# Altium footprint library connectors.PcbLib: 256 footprints (part 6 of 16)
Each footprint in its own frame and in the unit in brackets; x right, y up, seen from the top. Pads: shape width x height; smd on the part's side, far side on the other; paste and mask are expansions set on the pad; w line width, h text height; cw(c..) or ccw(c..) is an arc to the next point about the centre after c.
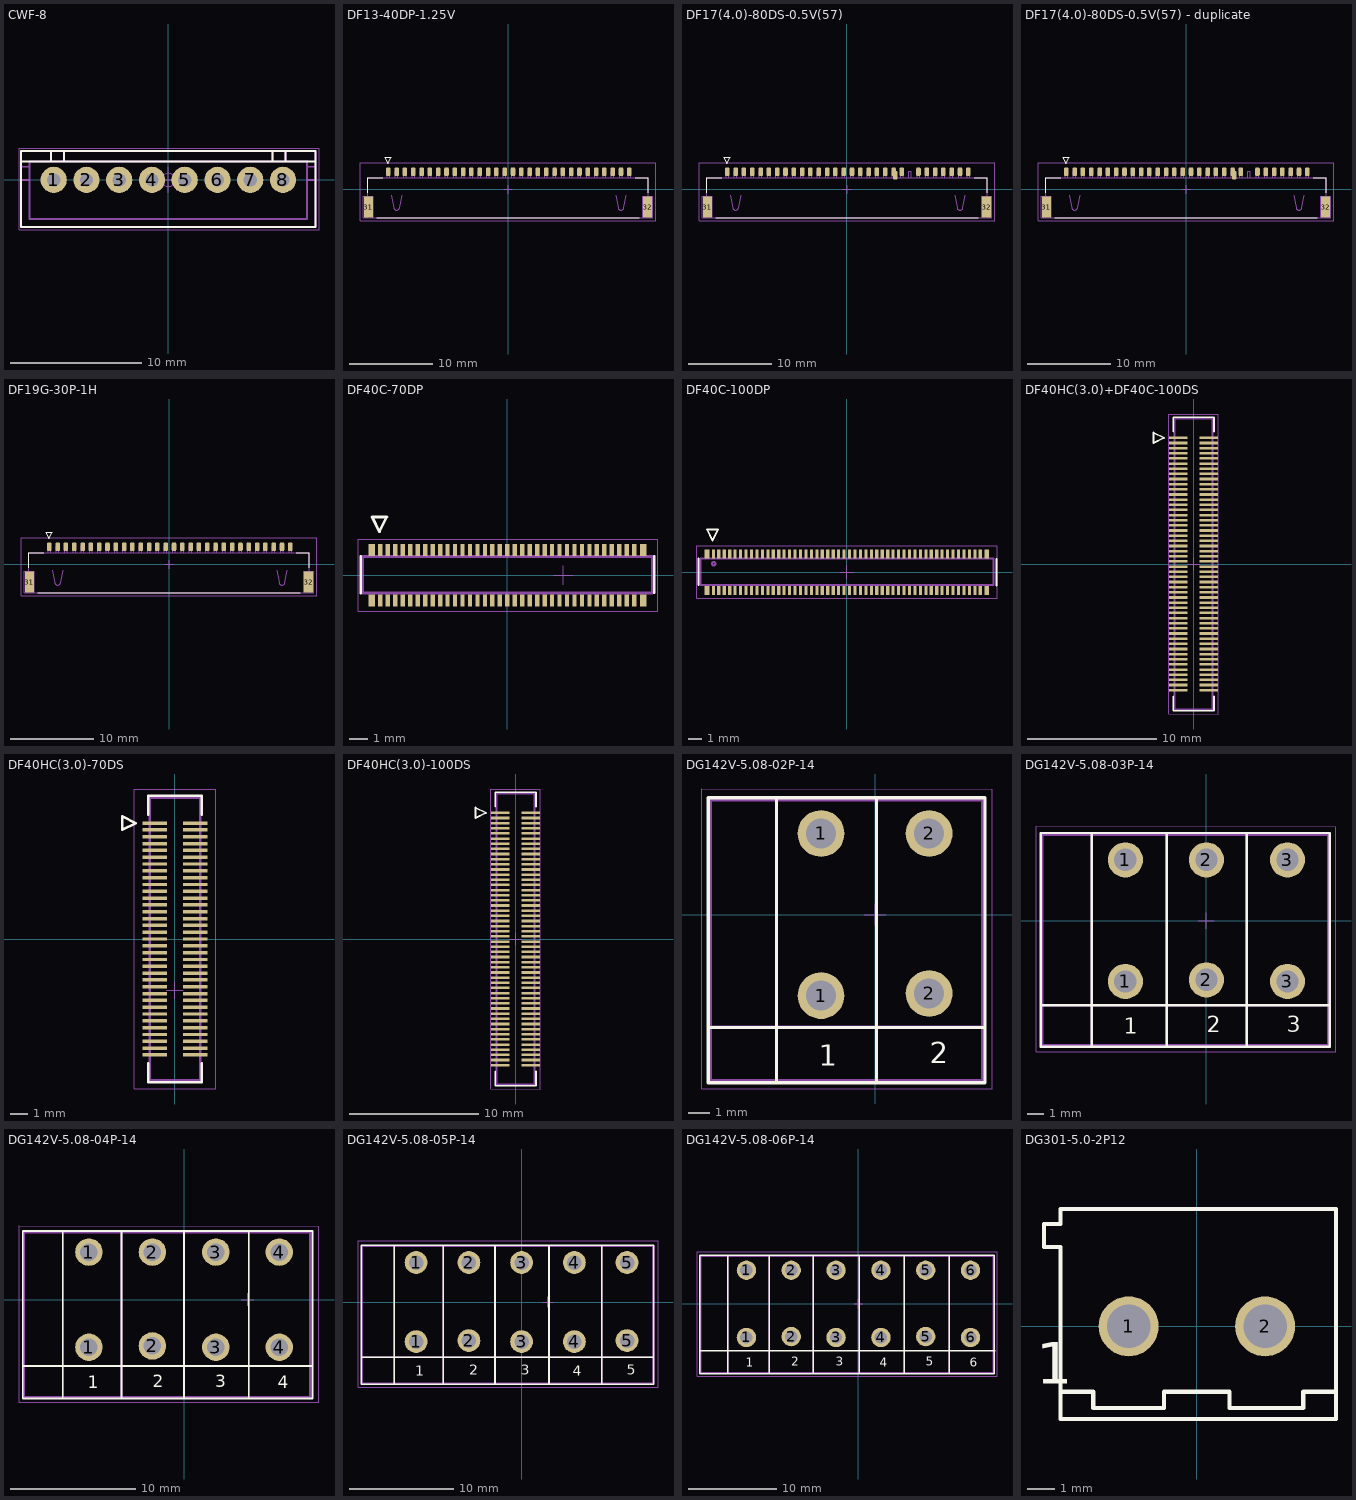
[diagram p5: the footprints below, top view; thin cyan lines are the x and y axes]

## CWF-8 [mm]
pads (8):
  round 2 hole 1: 1(-8.75,0) 2(-6.25,0) 3(-3.75,0) 4(-1.25,0) 5(1.25,0) 6(3.75,0) 7(6.25,0) 8(8.75,0)
Top Overlay:
  lines w0.15: -11.24,1.4 11.25,1.4 ; -8.95,1.4 -8.95,2.2 ; -7.95,1.4 -7.95,2.2 ; 7.95,1.4 7.95,2.2 ; 8.95,1.4 8.95,2.2 ; -11.24,-3.6 11.25,-3.6 11.25,2.2 -11.24,2.2 -11.24,-3.6
  text "." at -10,2.7 h1.52
TopAssy 13:
  lines w0.15: -11.24,0 -10.6,0 ; -11.24,1 -10.6,1 ; -8.95,1.5 -8.95,2.2 ; -7.95,1.5 -7.95,2.2 ; 7.95,1.5 7.95,2.2 ; 8.95,1.5 8.95,2.2 ; 10.6,0 11.25,0 ; 10.6,1 11.25,1 ; -11.24,-3.6 11.25,-3.6 11.25,2.2 -11.24,2.2 -11.24,-3.6 ; -10.6,-3 10.6,-3 10.6,1.4 -10.6,1.4 -10.6,-3
TopCourt 15:
  circle w0.05: c0,-0.007 r0.5
  lines w0.05: -0.998,-0.007 1.002,-0.007 ; 0,-1 0,1 ; -11.4,-3.8 11.5,-3.8 11.5,2.402 -11.4,2.402 -11.4,-3.8
3D body "User Library-CWF-8.step": height 7.05, standoff -3.45, extent -11.25,-3.55 11.25,2.2

## DF13-40DP-1.25V [mm] "1.25 mm Contact Pitch, Board-to-Cable"
height 1
pads (32):
  rrect50% 0.55x1 smd: 1(-14.4,2.125) 2(-13.4,2.125) 3(-12.4,2.125) 4(-11.4,2.125) 5(-10.4,2.125) 6(-9.4,2.125) 7(-8.4,2.125) 8(-7.4,2.125) 9(-6.4,2.125) 10(-5.4,2.125) 11(-4.4,2.125) 12(-3.4,2.125) 13(-2.4,2.125) 14(-1.4,2.125) 15(-0.4,2.125) 16(0.6,2.125) 17(1.6,2.125) 18(2.6,2.125) 19(3.6,2.125) 20(4.6,2.125) 21(5.6,2.125) 22(6.6,2.125) 23(7.6,2.125) 24(8.6,2.125) 25(9.6,2.125) 26(10.6,2.125) 27(11.6,2.125) 28(12.6,2.125) 29(13.6,2.125) 30(14.6,2.125)
  rect 1.1x2.5 smd: 31(-16.8,-2.125) 32(16.8,-2.125)
Top Overlay:
  lines w0.15: -16.9,-0.425 -16.9,1.375 -15.1,1.375 ; -15.8,-3.425 15.8,-3.425 ; 15.3,1.375 16.9,1.375 16.9,-0.425 ; -14.85,3.9 -14.05,3.9 -14.45,3.1 -14.85,3.9
TopAssy 13:
  lines w0.15: -17.1,-3.4 -17.1,-0.8 ; -14.55,1.4 -14.55,2.2 -14.25,2.2 -14.25,1.4 ; -14.05,-0.7 -13.75,-2.2 ccw(c-13.4,-2.15) -13.05,-2.2 -12.75,-0.7 ; -13.55,1.4 -13.55,2.2 -13.25,2.2 -13.25,1.4 ; -12.55,1.4 -12.55,2.2 -12.25,2.2 -12.25,1.4 ; -11.55,1.4 -11.55,2.2 -11.25,2.2 -11.25,1.4 ; -10.55,1.4 -10.55,2.2 -10.25,2.2 -10.25,1.4 ; -9.55,1.4 -9.55,2.2 -9.25,2.2 -9.25,1.4 ; -8.55,1.4 -8.55,2.2 -8.25,2.2 -8.25,1.4 ; -7.55,1.4 -7.55,2.2 -7.25,2.2 -7.25,1.4 ; -6.55,1.4 -6.55,2.2 -6.25,2.2 -6.25,1.4 ; -5.55,1.4 -5.55,2.2 -5.25,2.2 -5.25,1.4 ; -4.55,1.4 -4.55,2.2 -4.25,2.2 -4.25,1.4 ; -3.55,1.4 -3.55,2.2 -3.25,2.2 -3.25,1.4 ; -2.55,1.4 -2.55,2.2 -2.25,2.2 -2.25,1.4 ; -1.55,1.4 -1.55,2.2 -1.25,2.2 -1.25,1.4 ; -0.55,1.4 -0.55,2.2 -0.25,2.2 -0.25,1.4 ; 0.45,1.4 0.45,2.2 0.75,2.2 0.75,1.4 ; 1.45,1.4 1.45,2.2 1.75,2.2 1.75,1.4 ; 2.45,1.4 2.45,2.2 2.75,2.2 2.75,1.4 ; 3.45,1.4 3.45,2.2 3.75,2.2 3.75,1.4 ; 4.45,1.4 4.45,2.2 4.75,2.2 4.75,1.4 ; 5.45,1.4 5.45,2.2 5.75,2.2 5.75,1.4 ; 6.45,1.4 6.45,2.2 6.75,2.2 6.75,1.4 ; 7.45,1.4 7.45,2.2 7.75,2.2 7.75,1.4 ; 8.45,1.4 8.45,2.2 8.75,2.2 8.75,1.4 ; 9.45,1.4 9.45,2.2 9.75,2.2 9.75,1.4 ; 10.45,1.4 10.45,2.2 10.75,2.2 10.75,1.4 ; 11.45,1.4 11.45,2.2 11.75,2.2 11.75,1.4 ; 12.45,1.4 12.45,2.2 12.75,2.2 12.75,1.4 ; 12.95,-0.7 13.25,-2.2 ccw(c13.6,-2.15) 13.95,-2.2 14.25,-0.7 ; 13.45,1.4 13.45,2.2 13.75,2.2 13.75,1.4 ; 14.45,1.4 14.45,2.2 14.75,2.2 14.75,1.4 ; 17.1,-3.4 17.1,-0.8 ; -17.4,-3.4 -17.4,-0.8 -16.2,-0.8 -16.2,-3.4 -17.4,-3.4 ; -16.9,-3.4 -16.9,1.375 16.9,1.375 16.9,-3.4 -16.9,-3.4 ; 16.2,-3.4 17.4,-3.4 17.4,-0.8 16.2,-0.8 16.2,-3.4
TopCourt 15:
  lines w0.05: -0.5,0 0.5,0 ; 0,-0.5 0,0.5 ; -17.8,-3.8 17.8,-3.8 17.8,3.2 -17.8,3.2 -17.8,-3.8
3D body "User Library-df13.step": height 5.63, standoff 0.23, extent -15.45,-2.125 15.4,4.775

## DF17(4.0)-80DS-0.5V(57) [mm] "0.5 mm Contact Pitch, Board-to-Board FCI / Amphenol:"
height 3.5
pads (32):
  rrect50% 0.55x1 smd: 1(-14.4,2.125) 2(-13.4,2.125) 3(-12.4,2.125) 4(-11.4,2.125) 5(-10.4,2.125) 6(-9.4,2.125) 7(-8.4,2.125) 8(-7.4,2.125) 9(-6.4,2.125) 10(-5.4,2.125) 11(-4.4,2.125) 12(-3.4,2.125) 13(-2.4,2.125) 14(-1.4,2.125) 15(-0.4,2.125) 16(0.6,2.125) 17(1.6,2.125) 18(2.6,2.125) 19(3.6,2.125) 20(4.6,2.125) 21(5.6,2.125) 22(6.6,2.125) 23(5.8,1.7) 24(8.6,2.125) 25(9.6,2.125) 26(10.6,2.125) 27(11.6,2.125) 28(12.6,2.125) 29(13.6,2.125) 30(14.6,2.125)
  rect 1.1x2.5 smd: 31(-16.8,-2.125) 32(16.8,-2.125)
Top Overlay:
  lines w0.15: -16.9,-0.425 -16.9,1.375 -15.1,1.375 ; -15.8,-3.425 15.8,-3.425 ; 15.3,1.375 16.9,1.375 16.9,-0.425 ; -14.85,3.9 -14.05,3.9 -14.45,3.1 -14.85,3.9
TopAssy 13:
  lines w0.15: -17.1,-3.4 -17.1,-0.8 ; -14.55,1.4 -14.55,2.2 -14.25,2.2 -14.25,1.4 ; -14.05,-0.7 -13.75,-2.2 ccw(c-13.4,-2.15) -13.05,-2.2 -12.75,-0.7 ; -13.55,1.4 -13.55,2.2 -13.25,2.2 -13.25,1.4 ; -12.55,1.4 -12.55,2.2 -12.25,2.2 -12.25,1.4 ; -11.55,1.4 -11.55,2.2 -11.25,2.2 -11.25,1.4 ; -10.55,1.4 -10.55,2.2 -10.25,2.2 -10.25,1.4 ; -9.55,1.4 -9.55,2.2 -9.25,2.2 -9.25,1.4 ; -8.55,1.4 -8.55,2.2 -8.25,2.2 -8.25,1.4 ; -7.55,1.4 -7.55,2.2 -7.25,2.2 -7.25,1.4 ; -6.55,1.4 -6.55,2.2 -6.25,2.2 -6.25,1.4 ; -5.55,1.4 -5.55,2.2 -5.25,2.2 -5.25,1.4 ; -4.55,1.4 -4.55,2.2 -4.25,2.2 -4.25,1.4 ; -3.55,1.4 -3.55,2.2 -3.25,2.2 -3.25,1.4 ; -2.55,1.4 -2.55,2.2 -2.25,2.2 -2.25,1.4 ; -1.55,1.4 -1.55,2.2 -1.25,2.2 -1.25,1.4 ; -0.55,1.4 -0.55,2.2 -0.25,2.2 -0.25,1.4 ; 0.45,1.4 0.45,2.2 0.75,2.2 0.75,1.4 ; 1.45,1.4 1.45,2.2 1.75,2.2 1.75,1.4 ; 2.45,1.4 2.45,2.2 2.75,2.2 2.75,1.4 ; 3.45,1.4 3.45,2.2 3.75,2.2 3.75,1.4 ; 4.45,1.4 4.45,2.2 4.75,2.2 4.75,1.4 ; 5.45,1.4 5.45,2.2 5.75,2.2 5.75,1.4 ; 6.45,1.4 6.45,2.2 6.75,2.2 6.75,1.4 ; 7.45,1.4 7.45,2.2 7.75,2.2 7.75,1.4 ; 8.45,1.4 8.45,2.2 8.75,2.2 8.75,1.4 ; 9.45,1.4 9.45,2.2 9.75,2.2 9.75,1.4 ; 10.45,1.4 10.45,2.2 10.75,2.2 10.75,1.4 ; 11.45,1.4 11.45,2.2 11.75,2.2 11.75,1.4 ; 12.45,1.4 12.45,2.2 12.75,2.2 12.75,1.4 ; 12.95,-0.7 13.25,-2.2 ccw(c13.6,-2.15) 13.95,-2.2 14.25,-0.7 ; 13.45,1.4 13.45,2.2 13.75,2.2 13.75,1.4 ; 14.45,1.4 14.45,2.2 14.75,2.2 14.75,1.4 ; 17.1,-3.4 17.1,-0.8 ; -17.4,-3.4 -17.4,-0.8 -16.2,-0.8 -16.2,-3.4 -17.4,-3.4 ; -16.9,-3.4 -16.9,1.375 16.9,1.375 16.9,-3.4 -16.9,-3.4 ; 16.2,-3.4 17.4,-3.4 17.4,-0.8 16.2,-0.8 16.2,-3.4
TopCourt 15:
  lines w0.05: -0.5,0 0.5,0 ; 0,-0.5 0,0.5 ; -17.8,-3.8 17.8,-3.8 17.8,3.2 -17.8,3.2 -17.8,-3.8
3D body "DF17(4_0)-80DS-0_5V.stp": height 5.33, standoff 0.23, extent -13.8,-3.45 11.2,2.25

## DF17(4.0)-80DS-0.5V(57) - duplicate [mm] "0.5 mm Contact Pitch, Board-to-Board FCI / Amphenol:"
height 3.5
pads (32):
  rrect50% 0.55x1 smd: 1(-14.4,2.125) 2(-13.4,2.125) 3(-12.4,2.125) 4(-11.4,2.125) 5(-10.4,2.125) 6(-9.4,2.125) 7(-8.4,2.125) 8(-7.4,2.125) 9(-6.4,2.125) 10(-5.4,2.125) 11(-4.4,2.125) 12(-3.4,2.125) 13(-2.4,2.125) 14(-1.4,2.125) 15(-0.4,2.125) 16(0.6,2.125) 17(1.6,2.125) 18(2.6,2.125) 19(3.6,2.125) 20(4.6,2.125) 21(5.6,2.125) 22(6.6,2.125) 23(5.8,1.7) 24(8.6,2.125) 25(9.6,2.125) 26(10.6,2.125) 27(11.6,2.125) 28(12.6,2.125) 29(13.6,2.125) 30(14.6,2.125)
  rect 1.1x2.5 smd: 31(-16.8,-2.125) 32(16.8,-2.125)
Top Overlay:
  lines w0.15: -16.9,-0.425 -16.9,1.375 -15.1,1.375 ; -15.8,-3.425 15.8,-3.425 ; 15.3,1.375 16.9,1.375 16.9,-0.425 ; -14.85,3.9 -14.05,3.9 -14.45,3.1 -14.85,3.9
TopAssy 13:
  lines w0.15: -17.1,-3.4 -17.1,-0.8 ; -14.55,1.4 -14.55,2.2 -14.25,2.2 -14.25,1.4 ; -14.05,-0.7 -13.75,-2.2 ccw(c-13.4,-2.15) -13.05,-2.2 -12.75,-0.7 ; -13.55,1.4 -13.55,2.2 -13.25,2.2 -13.25,1.4 ; -12.55,1.4 -12.55,2.2 -12.25,2.2 -12.25,1.4 ; -11.55,1.4 -11.55,2.2 -11.25,2.2 -11.25,1.4 ; -10.55,1.4 -10.55,2.2 -10.25,2.2 -10.25,1.4 ; -9.55,1.4 -9.55,2.2 -9.25,2.2 -9.25,1.4 ; -8.55,1.4 -8.55,2.2 -8.25,2.2 -8.25,1.4 ; -7.55,1.4 -7.55,2.2 -7.25,2.2 -7.25,1.4 ; -6.55,1.4 -6.55,2.2 -6.25,2.2 -6.25,1.4 ; -5.55,1.4 -5.55,2.2 -5.25,2.2 -5.25,1.4 ; -4.55,1.4 -4.55,2.2 -4.25,2.2 -4.25,1.4 ; -3.55,1.4 -3.55,2.2 -3.25,2.2 -3.25,1.4 ; -2.55,1.4 -2.55,2.2 -2.25,2.2 -2.25,1.4 ; -1.55,1.4 -1.55,2.2 -1.25,2.2 -1.25,1.4 ; -0.55,1.4 -0.55,2.2 -0.25,2.2 -0.25,1.4 ; 0.45,1.4 0.45,2.2 0.75,2.2 0.75,1.4 ; 1.45,1.4 1.45,2.2 1.75,2.2 1.75,1.4 ; 2.45,1.4 2.45,2.2 2.75,2.2 2.75,1.4 ; 3.45,1.4 3.45,2.2 3.75,2.2 3.75,1.4 ; 4.45,1.4 4.45,2.2 4.75,2.2 4.75,1.4 ; 5.45,1.4 5.45,2.2 5.75,2.2 5.75,1.4 ; 6.45,1.4 6.45,2.2 6.75,2.2 6.75,1.4 ; 7.45,1.4 7.45,2.2 7.75,2.2 7.75,1.4 ; 8.45,1.4 8.45,2.2 8.75,2.2 8.75,1.4 ; 9.45,1.4 9.45,2.2 9.75,2.2 9.75,1.4 ; 10.45,1.4 10.45,2.2 10.75,2.2 10.75,1.4 ; 11.45,1.4 11.45,2.2 11.75,2.2 11.75,1.4 ; 12.45,1.4 12.45,2.2 12.75,2.2 12.75,1.4 ; 12.95,-0.7 13.25,-2.2 ccw(c13.6,-2.15) 13.95,-2.2 14.25,-0.7 ; 13.45,1.4 13.45,2.2 13.75,2.2 13.75,1.4 ; 14.45,1.4 14.45,2.2 14.75,2.2 14.75,1.4 ; 17.1,-3.4 17.1,-0.8 ; -17.4,-3.4 -17.4,-0.8 -16.2,-0.8 -16.2,-3.4 -17.4,-3.4 ; -16.9,-3.4 -16.9,1.375 16.9,1.375 16.9,-3.4 -16.9,-3.4 ; 16.2,-3.4 17.4,-3.4 17.4,-0.8 16.2,-0.8 16.2,-3.4
TopCourt 15:
  lines w0.05: -0.5,0 0.5,0 ; 0,-0.5 0,0.5 ; -17.8,-3.8 17.8,-3.8 17.8,3.2 -17.8,3.2 -17.8,-3.8
3D body "DF17(4_0)-80DP-0_5V.stp": height 6.97, standoff 0.07, extent -14,-4 11,1.7

## DF19G-30P-1H [mm] "1 mm Contact Pitch, Board-to-Cable"
height 1
pads (32):
  rrect50% 0.55x1 smd: 1(-14.4,2.125) 2(-13.4,2.125) 3(-12.4,2.125) 4(-11.4,2.125) 5(-10.4,2.125) 6(-9.4,2.125) 7(-8.4,2.125) 8(-7.4,2.125) 9(-6.4,2.125) 10(-5.4,2.125) 11(-4.4,2.125) 12(-3.4,2.125) 13(-2.4,2.125) 14(-1.4,2.125) 15(-0.4,2.125) 16(0.6,2.125) 17(1.6,2.125) 18(2.6,2.125) 19(3.6,2.125) 20(4.6,2.125) 21(5.6,2.125) 22(6.6,2.125) 23(7.6,2.125) 24(8.6,2.125) 25(9.6,2.125) 26(10.6,2.125) 27(11.6,2.125) 28(12.6,2.125) 29(13.6,2.125) 30(14.6,2.125)
  rect 1.1x2.5 smd: 31(-16.8,-2.125) 32(16.8,-2.125)
Top Overlay:
  lines w0.15: -16.9,-0.425 -16.9,1.375 -15.1,1.375 ; -15.8,-3.425 15.8,-3.425 ; 15.3,1.375 16.9,1.375 16.9,-0.425 ; -14.85,3.9 -14.05,3.9 -14.45,3.1 -14.85,3.9
TopAssy 13:
  lines w0.15: -17.1,-3.4 -17.1,-0.8 ; -14.55,1.4 -14.55,2.2 -14.25,2.2 -14.25,1.4 ; -14.05,-0.7 -13.75,-2.2 ccw(c-13.4,-2.15) -13.05,-2.2 -12.75,-0.7 ; -13.55,1.4 -13.55,2.2 -13.25,2.2 -13.25,1.4 ; -12.55,1.4 -12.55,2.2 -12.25,2.2 -12.25,1.4 ; -11.55,1.4 -11.55,2.2 -11.25,2.2 -11.25,1.4 ; -10.55,1.4 -10.55,2.2 -10.25,2.2 -10.25,1.4 ; -9.55,1.4 -9.55,2.2 -9.25,2.2 -9.25,1.4 ; -8.55,1.4 -8.55,2.2 -8.25,2.2 -8.25,1.4 ; -7.55,1.4 -7.55,2.2 -7.25,2.2 -7.25,1.4 ; -6.55,1.4 -6.55,2.2 -6.25,2.2 -6.25,1.4 ; -5.55,1.4 -5.55,2.2 -5.25,2.2 -5.25,1.4 ; -4.55,1.4 -4.55,2.2 -4.25,2.2 -4.25,1.4 ; -3.55,1.4 -3.55,2.2 -3.25,2.2 -3.25,1.4 ; -2.55,1.4 -2.55,2.2 -2.25,2.2 -2.25,1.4 ; -1.55,1.4 -1.55,2.2 -1.25,2.2 -1.25,1.4 ; -0.55,1.4 -0.55,2.2 -0.25,2.2 -0.25,1.4 ; 0.45,1.4 0.45,2.2 0.75,2.2 0.75,1.4 ; 1.45,1.4 1.45,2.2 1.75,2.2 1.75,1.4 ; 2.45,1.4 2.45,2.2 2.75,2.2 2.75,1.4 ; 3.45,1.4 3.45,2.2 3.75,2.2 3.75,1.4 ; 4.45,1.4 4.45,2.2 4.75,2.2 4.75,1.4 ; 5.45,1.4 5.45,2.2 5.75,2.2 5.75,1.4 ; 6.45,1.4 6.45,2.2 6.75,2.2 6.75,1.4 ; 7.45,1.4 7.45,2.2 7.75,2.2 7.75,1.4 ; 8.45,1.4 8.45,2.2 8.75,2.2 8.75,1.4 ; 9.45,1.4 9.45,2.2 9.75,2.2 9.75,1.4 ; 10.45,1.4 10.45,2.2 10.75,2.2 10.75,1.4 ; 11.45,1.4 11.45,2.2 11.75,2.2 11.75,1.4 ; 12.45,1.4 12.45,2.2 12.75,2.2 12.75,1.4 ; 12.95,-0.7 13.25,-2.2 ccw(c13.6,-2.15) 13.95,-2.2 14.25,-0.7 ; 13.45,1.4 13.45,2.2 13.75,2.2 13.75,1.4 ; 14.45,1.4 14.45,2.2 14.75,2.2 14.75,1.4 ; 17.1,-3.4 17.1,-0.8 ; -17.4,-3.4 -17.4,-0.8 -16.2,-0.8 -16.2,-3.4 -17.4,-3.4 ; -16.9,-3.4 -16.9,1.375 16.9,1.375 16.9,-3.4 -16.9,-3.4 ; 16.2,-3.4 17.4,-3.4 17.4,-0.8 16.2,-0.8 16.2,-3.4
TopCourt 15:
  lines w0.05: -0.5,0 0.5,0 ; 0,-0.5 0,0.5 ; -17.8,-3.8 17.8,-3.8 17.8,3.2 -17.8,3.2 -17.8,-3.8
3D body "DF19G-30P_K180114005_Stig-Wahlstrom.step": height 1.66, standoff 0.01, extent -17,-3.375 16.95,2.325

## DF40C-70DP [mm] "0.5 mm Contact Pitch, Board-to-Board FCI / Amphenol:"
height 3.5
pads (74):
  rect 0.35x0.66 smd: 0(-7.275,-1.355) 0(-7.275,1.355) 0(7.275,-1.355) 0(7.275,1.355)
  rect 0.23x0.66 smd: 1(-6.8,1.355) 2(-6.8,-1.355) 3(-6.4,1.355) 4(-6.4,-1.355) 5(-6,1.355) 6(-6,-1.355) 7(-5.6,1.355) 8(-5.6,-1.355) 9(-5.2,1.355) 10(-5.2,-1.355) 11(-4.8,1.355) 12(-4.8,-1.355) 13(-4.4,1.355) 14(-4.4,-1.355) 15(-4,1.355) 16(-4,-1.355) 17(-3.6,1.355) 18(-3.6,-1.355) 19(-3.2,1.355) 20(-3.2,-1.355) 21(-2.8,1.355) 22(-2.8,-1.355) 23(-2.4,1.355) 24(-2.4,-1.355) 25(-2,1.355) 26(-2,-1.355) 27(-1.6,1.355) 28(-1.6,-1.355) 29(-1.2,1.355) 30(-1.2,-1.355) 31(-0.8,1.355) 32(-0.8,-1.355) 33(-0.4,1.355) 34(-0.4,-1.355) 35(0,1.355) 36(0,-1.355) 37(0.4,1.355) 38(0.4,-1.355) 39(0.8,1.355) 40(0.8,-1.355) 41(1.2,1.355) 42(1.2,-1.355) 43(1.6,1.355) 44(1.6,-1.355) 45(2,1.355) 46(2,-1.355) 47(2.4,1.355) 48(2.4,-1.355) 49(2.8,1.355) 50(2.8,-1.355) 51(3.2,1.355) 52(3.2,-1.355) 53(3.6,1.355) 54(3.6,-1.355) 55(4,1.355) 56(4,-1.355) 57(4.4,1.355) 58(4.4,-1.355) 59(4.8,1.355) 60(4.8,-1.355) 61(5.2,1.355) 62(5.2,-1.355) 63(5.6,1.355) 64(5.6,-1.355) 65(6,1.355) 66(6,-1.355) 67(6.4,1.355) 68(6.4,-1.355) 69(6.8,1.355) 70(6.8,-1.355)
Top Overlay:
  lines w0.15: -7.85,-0.95 -7.85,1 ; 7.875,-0.925 7.875,1.025 ; -7.25,3.13 -6.45,3.13 -6.85,2.33 -7.25,3.13
TopAssy 13:
  lines w0.15: -7.75,-0.945 7.775,-0.945 7.775,1.005 -7.75,1.005 -7.75,-0.945
TopCourt 15:
  lines w0.05: 2.5,0 3.5,0 ; 3,-0.5 3,0.5 ; -8,-1.92 8.075,-1.92 8.075,1.93 -8,1.93 -8,-1.92
3D body "DF40C-70DP.stp": height 1.12, standoff -0.02, extent -7.75,-1.465 7.77,1.505

## DF40C-100DP [mm] "0.5 mm Contact Pitch, Board-to-Board FCI / Amphenol:"
height 3.5
pads (104):
  rect 0.35x0.66 smd mask+0.03: 0(-10.275,-1.355) 0(-10.275,1.355) 0(10.275,-1.355) 0(10.275,1.355)
  rect 0.23x0.66 smd mask+0.03: 1(-9.8,1.355) 2(-9.8,-1.355) 3(-9.4,1.355) 4(-9.4,-1.355) 5(-9,1.355) 6(-9,-1.355) 7(-8.6,1.355) 8(-8.6,-1.355) 9(-8.2,1.355) 10(-8.2,-1.355) 11(-7.8,1.355) 12(-7.8,-1.355) 13(-7.4,1.355) 14(-7.4,-1.355) 15(-7,1.355) 16(-7,-1.355) 17(-6.6,1.355) 18(-6.6,-1.355) 19(-6.2,1.355) 20(-6.2,-1.355) 21(-5.8,1.355) 22(-5.8,-1.355) 23(-5.4,1.355) 24(-5.4,-1.355) 25(-5,1.355) 26(-5,-1.355) 27(-4.6,1.355) 28(-4.6,-1.355) 29(-4.2,1.355) 30(-4.2,-1.355) 31(-3.8,1.355) 32(-3.8,-1.355) 33(-3.4,1.355) 34(-3.4,-1.355) 35(-3,1.355) 36(-3,-1.355) 37(-2.6,1.355) 38(-2.6,-1.355) 39(-2.2,1.355) 40(-2.2,-1.355) 41(-1.8,1.355) 42(-1.8,-1.355) 43(-1.4,1.355) 44(-1.4,-1.355) 45(-1,1.355) 46(-1,-1.355) 47(-0.6,1.355) 48(-0.6,-1.355) 49(-0.2,1.355) 50(-0.2,-1.355) 51(0.2,1.355) 52(0.2,-1.355) 53(0.6,1.355) 54(0.6,-1.355) 55(1,1.355) 56(1,-1.355) 57(1.4,1.355) 58(1.4,-1.355) 59(1.8,1.355) 60(1.8,-1.355) 61(2.2,1.355) 62(2.2,-1.355) 63(2.6,1.355) 64(2.6,-1.355) 65(3,1.355) 66(3,-1.355) 67(3.4,1.355) 68(3.4,-1.355) 69(3.8,1.355) 70(3.8,-1.355) 71(4.2,1.355) 72(4.2,-1.355) 73(4.6,1.355) 74(4.6,-1.355) 75(5,1.355) 76(5,-1.355) 77(5.4,1.355) 78(5.4,-1.355) 79(5.8,1.355) 80(5.8,-1.355) 81(6.2,1.355) 82(6.2,-1.355) 83(6.6,1.355) 84(6.6,-1.355) 85(7,1.355) 86(7,-1.355) 87(7.4,1.355) 88(7.4,-1.355) 89(7.8,1.355) 90(7.8,-1.355) 91(8.2,1.355) 92(8.2,-1.355) 93(8.6,1.355) 94(8.6,-1.355) 95(9,1.355) 96(9,-1.355) 97(9.4,1.355) 98(9.4,-1.355) 99(9.8,1.355) 100(9.8,-1.355)
Top Overlay:
  lines w0.15: -10.875,-0.945 -10.875,1.005 ; 11,-0.97 11,0.98 ; -10.25,3.13 -9.45,3.13 -9.85,2.33 -10.25,3.13
TopAssy 13:
  circle w0.15: c-9.775,0.625 r0.125
  lines w0.15: -10.75,-0.945 10.775,-0.945 10.775,1.005 -10.75,1.005 -10.75,-0.945
TopCourt 15:
  lines w0.05: -0.5,0 0.5,0 ; 0,-0.5 0,0.5 ; -11,-1.92 11.025,-1.92 11.025,1.93 -11,1.93 -11,-1.92
3D body "DF40C-100DP.stp": height 1.12, standoff -0.02, extent -10.76,-1.485 10.76,1.485

## DF40HC(3.0)+DF40C-100DS [mm] "0.5 mm Contact Pitch, Board-to-Board FCI / Amphenol:"
height 3.5
pads (100):
  rect 1.43x0.2 smd: 1(-1.19,9.8) 2(1.19,9.8) 3(-1.19,9.4) 4(1.19,9.4) 5(-1.19,9) 6(1.19,9) 7(-1.19,8.6) 8(1.19,8.6) 9(-1.19,8.2) 10(1.19,8.2) 11(-1.19,7.8) 12(1.19,7.8) 13(-1.19,7.4) 14(1.19,7.4) 15(-1.19,7) 16(1.19,7) 17(-1.19,6.6) 18(1.19,6.6) 19(-1.19,6.2) 20(1.19,6.2) 21(-1.19,5.8) 22(1.19,5.8) 23(-1.19,5.4) 24(1.19,5.4) 25(-1.19,5) 26(1.19,5) 27(-1.19,4.6) 28(1.19,4.6) 29(-1.19,4.2) 30(1.19,4.2) 31(-1.19,3.8) 32(1.19,3.8) 33(-1.19,3.4) 34(1.19,3.4) 35(-1.19,3) 36(1.19,3) 37(-1.19,2.6) 38(1.19,2.6) 39(-1.19,2.2) 40(1.19,2.2) 41(-1.19,1.8) 42(1.19,1.8) 43(-1.19,1.4) 44(1.19,1.4) 45(-1.19,1) 46(1.19,1) 47(-1.19,0.6) 48(1.19,0.6) 49(-1.19,0.2) 50(1.19,0.2) 51(-1.19,-0.2) 52(1.19,-0.2) 53(-1.19,-0.6) 54(1.19,-0.6) 55(-1.19,-1) 56(1.19,-1) 57(-1.19,-1.4) 58(1.19,-1.4) 59(-1.19,-1.8) 60(1.19,-1.8) 61(-1.19,-2.2) 62(1.19,-2.2) 63(-1.19,-2.6) 64(1.19,-2.6) 65(-1.19,-3) 66(1.19,-3) 67(-1.19,-3.4) 68(1.19,-3.4) 69(-1.19,-3.8) 70(1.19,-3.8) 71(-1.19,-4.2) 72(1.19,-4.2) 73(-1.19,-4.6) 74(1.19,-4.6) 75(-1.19,-5) 76(1.19,-5) 77(-1.19,-5.4) 78(1.19,-5.4) 79(-1.19,-5.8) 80(1.19,-5.8) 81(-1.19,-6.2) 82(1.19,-6.2) 83(-1.19,-6.6) 84(1.19,-6.6) 85(-1.19,-7) 86(1.19,-7) 87(-1.19,-7.4) 88(1.19,-7.4) 89(-1.19,-7.8) 90(1.19,-7.8) 91(-1.19,-8.2) 92(1.19,-8.2) 93(-1.19,-8.6) 94(1.19,-8.6) 95(-1.19,-9) 96(1.19,-9) 97(-1.19,-9.4) 98(1.19,-9.4) 99(-1.19,-9.8) 100(1.19,-9.8)
Top Overlay:
  lines w0.15: -1.575,-10.3 -1.575,-11.4 1.575,-11.4 1.575,-10.3 ; -1.575,10.3 -1.575,11.4 1.575,11.4 1.575,10.3 ; -3.1,9.4 -2.3,9.8 -3.1,10.2 -3.1,9.4
TopAssy 13:
  lines w0.15: -1.475,-11.3 -1.475,11.3 1.475,11.3 1.475,-11.3 -1.475,-11.3
TopCourt 15:
  lines w0.05: -0.5,0 0.5,0 ; 0,-0.5 0,0.5 ; -1.92,-11.65 -1.92,11.65 1.93,11.65 1.93,-11.65 -1.92,-11.65
3D body "DF40C-100DS.stp": height 1.44, standoff -0.01, extent -1.7,-11.3 1.68,11.3
3D body "DF40C-100DP.stp": height 3.05, standoff 1.91, extent -1.485,-10.76 1.485,10.76

## DF40HC(3.0)-70DS [mm] "0.5 mm Contact Pitch, Board-to-Board FCI / Amphenol:"
height 3.5
pads (70):
  rect 1.43x0.2 smd: 1(-1.19,6.8) 2(1.19,6.8) 3(-1.19,6.4) 4(1.19,6.4) 5(-1.19,6) 6(1.19,6) 7(-1.19,5.6) 8(1.19,5.6) 9(-1.19,5.2) 10(1.19,5.2) 11(-1.19,4.8) 12(1.19,4.8) 13(-1.19,4.4) 14(1.19,4.4) 15(-1.19,4) 16(1.19,4) 17(-1.19,3.6) 18(1.19,3.6) 19(-1.19,3.2) 20(1.19,3.2) 21(-1.19,2.8) 22(1.19,2.8) 23(-1.19,2.4) 24(1.19,2.4) 25(-1.19,2) 26(1.19,2) 27(-1.19,1.6) 28(1.19,1.6) 29(-1.19,1.2) 30(1.19,1.2) 31(-1.19,0.8) 32(1.19,0.8) 33(-1.19,0.4) 34(1.19,0.4) 35(-1.19,0) 36(1.19,0) 37(-1.19,-0.4) 38(1.19,-0.4) 39(-1.19,-0.8) 40(1.19,-0.8) 41(-1.19,-1.2) 42(1.19,-1.2) 43(-1.19,-1.6) 44(1.19,-1.6) 45(-1.19,-2) 46(1.19,-2) 47(-1.19,-2.4) 48(1.19,-2.4) 49(-1.19,-2.8) 50(1.19,-2.8) 51(-1.19,-3.2) 52(1.19,-3.2) 53(-1.19,-3.6) 54(1.19,-3.6) 55(-1.19,-4) 56(1.19,-4) 57(-1.19,-4.4) 58(1.19,-4.4) 59(-1.19,-4.8) 60(1.19,-4.8) 61(-1.19,-5.2) 62(1.19,-5.2) 63(-1.19,-5.6) 64(1.19,-5.6) 65(-1.19,-6) 66(1.19,-6) 67(-1.19,-6.4) 68(1.19,-6.4) 69(-1.19,-6.8) 70(1.19,-6.8)
Top Overlay:
  lines w0.15: -1.575,-7.3 -1.575,-8.4 1.575,-8.4 1.575,-7.3 ; -1.575,7.3 -1.575,8.4 1.575,8.4 1.575,7.3 ; -3.1,6.4 -3.1,7.2 -2.3,6.8 -3.1,6.4
TopAssy 13:
  lines w0.15: -1.475,-8.3 -1.475,8.3 1.475,8.3 1.475,-8.3 -1.475,-8.3
TopCourt 15:
  lines w0.05: -0.5,-3 0.5,-3 ; 0,-3.5 0,-2.5 ; -2.4,-8.8 2.4,-8.8 2.4,8.8 -2.4,8.8 -2.4,-8.8
3D body "DF40HC(3.0)-70DS.stp": height 2.9, standoff 0, extent -1.69,-8.3 1.69,8.3

## DF40HC(3.0)-100DS [mm] "0.5 mm Contact Pitch, Board-to-Board FCI / Amphenol:"
height 3.5
pads (100):
  rect 1.43x0.2 smd mask+0.05: 1(-1.19,9.8) 2(1.19,9.8) 3(-1.19,9.4) 4(1.19,9.4) 5(-1.19,9) 6(1.19,9) 7(-1.19,8.6) 8(1.19,8.6) 9(-1.19,8.2) 10(1.19,8.2) 11(-1.19,7.8) 12(1.19,7.8) 13(-1.19,7.4) 14(1.19,7.4) 15(-1.19,7) 16(1.19,7) 17(-1.19,6.6) 18(1.19,6.6) 19(-1.19,6.2) 20(1.19,6.2) 21(-1.19,5.8) 22(1.19,5.8) 23(-1.19,5.4) 24(1.19,5.4) 25(-1.19,5) 26(1.19,5) 27(-1.19,4.6) 28(1.19,4.6) 29(-1.19,4.2) 30(1.19,4.2) 31(-1.19,3.8) 32(1.19,3.8) 33(-1.19,3.4) 34(1.19,3.4) 35(-1.19,3) 36(1.19,3) 37(-1.19,2.6) 38(1.19,2.6) 39(-1.19,2.2) 40(1.19,2.2) 41(-1.19,1.8) 42(1.19,1.8) 43(-1.19,1.4) 44(1.19,1.4) 45(-1.19,1) 46(1.19,1) 47(-1.19,0.6) 48(1.19,0.6) 49(-1.19,0.2) 50(1.19,0.2) 51(-1.19,-0.2) 52(1.19,-0.2) 53(-1.19,-0.6) 54(1.19,-0.6) 55(-1.19,-1) 56(1.19,-1) 57(-1.19,-1.4) 58(1.19,-1.4) 59(-1.19,-1.8) 60(1.19,-1.8) 61(-1.19,-2.2) 62(1.19,-2.2) 63(-1.19,-2.6) 64(1.19,-2.6) 65(-1.19,-3) 66(1.19,-3) 67(-1.19,-3.4) 68(1.19,-3.4) 69(-1.19,-3.8) 70(1.19,-3.8) 71(-1.19,-4.2) 72(1.19,-4.2) 73(-1.19,-4.6) 74(1.19,-4.6) 75(-1.19,-5) 76(1.19,-5) 77(-1.19,-5.4) 78(1.19,-5.4) 79(-1.19,-5.8) 80(1.19,-5.8) 81(-1.19,-6.2) 82(1.19,-6.2) 83(-1.19,-6.6) 84(1.19,-6.6) 85(-1.19,-7) 86(1.19,-7) 87(-1.19,-7.4) 88(1.19,-7.4) 89(-1.19,-7.8) 90(1.19,-7.8) 91(-1.19,-8.2) 92(1.19,-8.2) 93(-1.19,-8.6) 94(1.19,-8.6) 95(-1.19,-9) 96(1.19,-9) 97(-1.19,-9.4) 98(1.19,-9.4) 99(-1.19,-9.8) 100(1.19,-9.8)
Top Overlay:
  lines w0.15: -1.575,-10.3 -1.575,-11.4 1.575,-11.4 1.575,-10.3 ; -1.575,10.3 -1.575,11.4 1.575,11.4 1.575,10.3 ; -3.1,9.4 -2.3,9.8 -3.1,10.2 -3.1,9.4
TopAssy 13:
  lines w0.15: -1.475,-11.3 -1.475,11.3 1.475,11.3 1.475,-11.3 -1.475,-11.3
TopCourt 15:
  lines w0.05: -0.5,0 0.5,0 ; 0,-0.5 0,0.5 ; -1.92,-11.65 -1.92,11.65 1.93,11.65 1.93,-11.65 -1.92,-11.65
3D body "DF40HC(3.0)-100DS-0.4V.stp": height 2.86, standoff -0.04, extent -1.69,-11.3 1.69,11.3

## DG142V-5.08-02P-14 [mm] "Connector, DG142V-5.08-02P-14, 5.08 mm Pitch"
height 14.1
pads (4):
  round 2.2 hole 1.4: 1(-2.54,-3.81) 1(-2.54,3.81) 2(2.54,-3.71) 2(2.54,3.81)
Top Overlay:
  lines w0.15: -7.74,-5.31 5.06,-5.31 ; -4.64,-7.91 -4.64,5.49 ; 0.06,-7.91 0.06,5.49 ; -7.84,-7.91 5.16,-7.91 5.16,5.49 -7.84,5.49 -7.84,-7.91
  text "2" at 2.56,-7 h1
  text "1" at -2.64,-7.1 h1
TopAssy 13:
  lines w0.15: -7.74,-5.3 5.06,-5.3 ; -4.64,-7.8 -4.64,5.4 ; 0.06,-7.81 0.06,5.39 ; -7.74,-7.81 -7.74,5.39 5.06,5.39 5.06,-7.81 -7.74,-7.81
TopCourt 15:
  lines w0.05: -0.5,0 0.5,0 ; 0,-0.5 0,0.5 ; -8.14,-8.2 5.5,-8.2 5.5,5.897 -8.14,5.901 -8.14,-8.2
3D body "DG142V-2-5.08.SLDPRT.1.x_t": height 14.1, standoff -3.5, extent -7.66,-7.81 4.94,5.39

## DG142V-5.08-03P-14 [mm] "Connector, DG142V-5.08-02P-14, 5.08 mm Pitch"
height 14.1
pads (6):
  round 2.2 hole 1.4: 1(-5.08,-3.81) 1(-5.08,3.81) 2(0,-3.71) 2(0,3.81) 3(5.08,-3.81) 3(5.08,3.81)
Top Overlay:
  lines w0.15: -10.28,-5.31 7.72,-5.31 ; -7.18,-7.91 -7.18,5.49 ; -2.48,-7.91 -2.48,5.49 ; 2.52,-7.91 2.52,5.49 ; -10.38,-7.91 7.72,-7.91 7.72,5.49 -10.38,5.49 -10.38,-7.91
  text "3" at 5.02,-7 h1
  text "2" at 0.02,-7 h1
  text "1" at -5.18,-7.1 h1
TopAssy 13:
  lines w0.15: -10.28,-5.3 7.62,-5.3 ; -7.18,-7.8 -7.18,5.4 ; -2.48,-7.81 -2.48,5.39 ; 2.52,-7.81 2.52,5.39 ; -10.28,-7.81 7.62,-7.81 7.62,5.39 -10.28,5.39 -10.28,-7.81
TopCourt 15:
  lines w0.05: -0.5,0 0.5,0 ; 0,-0.5 0,0.5 ; -10.68,-8.2 8.12,-8.2 8.12,5.895 -10.68,5.901 -10.68,-8.2
3D body "DG142V-3-5.08.SLDPRT.1.x_t": height 14.1, standoff -3.5, extent -10.2,-7.81 7.48,5.39

## DG142V-5.08-04P-14 [mm] "Connector, DG142V-5.08-04P-14, 5.08 mm Pitch"
height 14.1
pads (8):
  round 2.2 hole 1.4: 1(-7.62,-3.81) 1(-7.62,3.81) 2(-2.54,-3.71) 2(-2.54,3.81) 3(2.54,-3.81) 3(2.54,3.81) 4(7.62,-3.81) 4(7.62,3.81)
Top Overlay:
  lines w0.15: -12.82,-5.31 10.28,-5.31 ; -9.72,-7.91 -9.72,5.49 ; -5.02,-7.91 -5.02,5.49 ; -0.02,-7.91 -0.02,5.49 ; 5.18,-7.91 5.18,5.49 ; -12.92,-7.91 -12.92,5.49 10.28,5.49 10.28,-7.91 -12.92,-7.91
  text "1" at -7.72,-7.1 h1
  text "2" at -2.52,-7 h1
  text "3" at 2.48,-7 h1
  text "4" at 7.48,-7.1 h1
TopAssy 13:
  lines w0.15: -12.82,-5.3 10.08,-5.3 ; -9.72,-7.8 -9.72,5.4 ; -5.02,-7.81 -5.02,5.39 ; -0.02,-7.81 -0.02,5.39 ; 5.18,-7.81 5.18,5.39 ; 10.08,-7.9 10.08,5.4 ; 10.08,-7.81 -12.82,-7.81 -12.82,5.39 10.08,5.39
TopCourt 15:
  lines w0.05: 4.58,0 5.58,0 ; 5.08,-0.5 5.08,0.5 ; -13.22,-8.2 -13.22,5.901 10.8,5.894 10.8,-8.2 -13.22,-8.2
3D body "DG142V-4-5.08.SLDPRT.1.x_t": height 14.1, standoff -3.5, extent -12.74,-7.81 10.02,5.39

## DG142V-5.08-05P-14 [mm] "Connector, DG142V-5.08-05P-14, 5.08 mm Pitch"
height 14.1
pads (10):
  round 2.2 hole 1.4: 1(-10.16,-3.81) 1(-10.16,3.81) 2(-5.08,-3.71) 2(-5.08,3.81) 3(0,-3.81) 3(0,3.81) 4(5.08,-3.81) 4(5.08,3.81) 5(10.16,-3.71) 5(10.16,3.81)
Top Overlay:
  lines w0.15: -15.36,-5.31 12.74,-5.31 ; -12.26,-7.91 -12.26,5.49 ; -7.56,-7.91 -7.56,5.49 ; -2.56,-7.91 -2.56,5.49 ; 2.64,-7.91 2.64,5.49 ; 7.74,-7.91 7.74,5.49 ; -15.46,-7.91 12.74,-7.91 12.74,5.49 -15.46,5.49 -15.46,-7.91
  text "5" at 10.14,-7 h1
  text "4" at 4.94,-7.1 h1
  text "3" at -0.06,-7 h1
  text "2" at -5.06,-7 h1
  text "1" at -10.26,-7.1 h1
TopAssy 13:
  lines w0.15: -15.36,-5.3 12.64,-5.3 ; -12.26,-7.8 -12.26,5.4 ; -7.56,-7.81 -7.56,5.39 ; -2.56,-7.81 -2.56,5.39 ; 2.64,-7.81 2.64,5.39 ; 7.74,-7.8 7.74,5.4 ; -15.36,-7.81 -15.36,5.39 12.64,5.39 12.64,-7.81 -15.36,-7.81
TopCourt 15:
  lines w0.05: 2.04,0 3.04,0 ; 2.54,-0.5 2.54,0.5 ; -15.76,-8.2 13.14,-8.2 13.14,5.893 -15.76,5.901 -15.76,-8.2
3D body "DG142V-5-5.08.SLDPRT.1.x_t": height 14.1, standoff -3.5, extent -15.28,-7.81 12.56,5.39

## DG142V-5.08-06P-14 [mm] "Connector, DG142V-5.08-06P-14, 5.08 mm Pitch"
height 14.1
pads (12):
  round 2.2 hole 1.4: 1(-12.7,-3.81) 1(-12.7,3.81) 2(-7.62,-3.71) 2(-7.62,3.81) 3(-2.54,-3.81) 3(-2.54,3.81) 4(2.54,-3.81) 4(2.54,3.81) 5(7.62,-3.71) 5(7.62,3.81) 6(12.7,-3.81) 6(12.7,3.81)
Top Overlay:
  lines w0.15: -17.9,-5.31 15.5,-5.31 ; -14.8,-7.91 -14.8,5.49 ; -10.1,-7.91 -10.1,5.49 ; -5.1,-7.91 -5.1,5.49 ; 0.1,-7.91 0.1,5.49 ; 5.2,-7.91 5.2,5.49 ; 10.3,-7.91 10.3,5.49 ; -18,-7.91 15.4,-7.91 15.4,5.49 -18,5.49 -18,-7.91
  text "1" at -12.8,-7.1 h1
  text "2" at -7.6,-7 h1
  text "3" at -2.6,-7 h1
  text "4" at 2.4,-7.1 h1
  text "5" at 7.6,-7 h1
  text "6" at 12.6,-7.1 h1
TopAssy 13:
  lines w0.15: -14.8,-7.8 -14.8,5.4 ; -10.1,-7.81 -10.1,5.39 ; -5.1,-7.81 -5.1,5.39 ; 0.1,-7.81 0.1,5.39 ; 5.2,-7.8 5.2,5.4 ; 10.3,-7.81 10.3,5.39 ; -17.9,-7.81 15.3,-7.81 15.3,5.39 -17.9,5.39 -17.9,-7.81
TopCourt 15:
  lines w0.05: -0.5,0 0.5,0 ; 0,-0.5 0,0.5 ; -18.3,-8.2 15.7,-8.2 15.7,5.891 -18.3,5.901 -18.3,-8.2
3D body "DG142V-6-5.08.SLDPRT.1.x_t": height 14.1, standoff -3.5, extent -17.82,-7.81 15.2,5.39

## DG301-5.0-2P12 [mm] "Разъем на плату, шаг 5, Terminal Block 2 x 5 mm Pitch"
height 12
pads (2):
  round 2.2 hole 1.6: 1(-2.5,0) 2(2.5,0)
Top Overlay:
  lines w0.15: -5,-2.4 -3.8,-2.4 -3.8,-3 -1.2,-3 -1.2,-2.4 1.2,-2.4 1.2,-3 3.9,-3 3.9,-2.4 5,-2.4 ; -5.6,2.9 -5.6,3.3 -5.6,3.75 -5,3.75 -5,4.3 5.1,4.3 5.1,-3.4 -5,-3.4 -5,2.4 -5,2.9 -5.6,2.9
  text "1" at -5.9,-2.1 h1.52
TopAssy 13:
3D body "User Library-DG301-5_0-2P12.STEP": height 10.1, standoff -4.06, extent -5.6,-3.4 5,4.2